# Altium footprint library Apalis Evaluation Board.PcbLib: 166 footprints (part 8 of 11)
Each footprint in its own frame and in the unit in brackets; x right, y up, seen from the top. Pads: shape width x height; smd on the part's side, far side on the other; paste and mask are expansions set on the pad; w line width, h text height; cw(c..) or ccw(c..) is an arc to the next point about the centre after c.
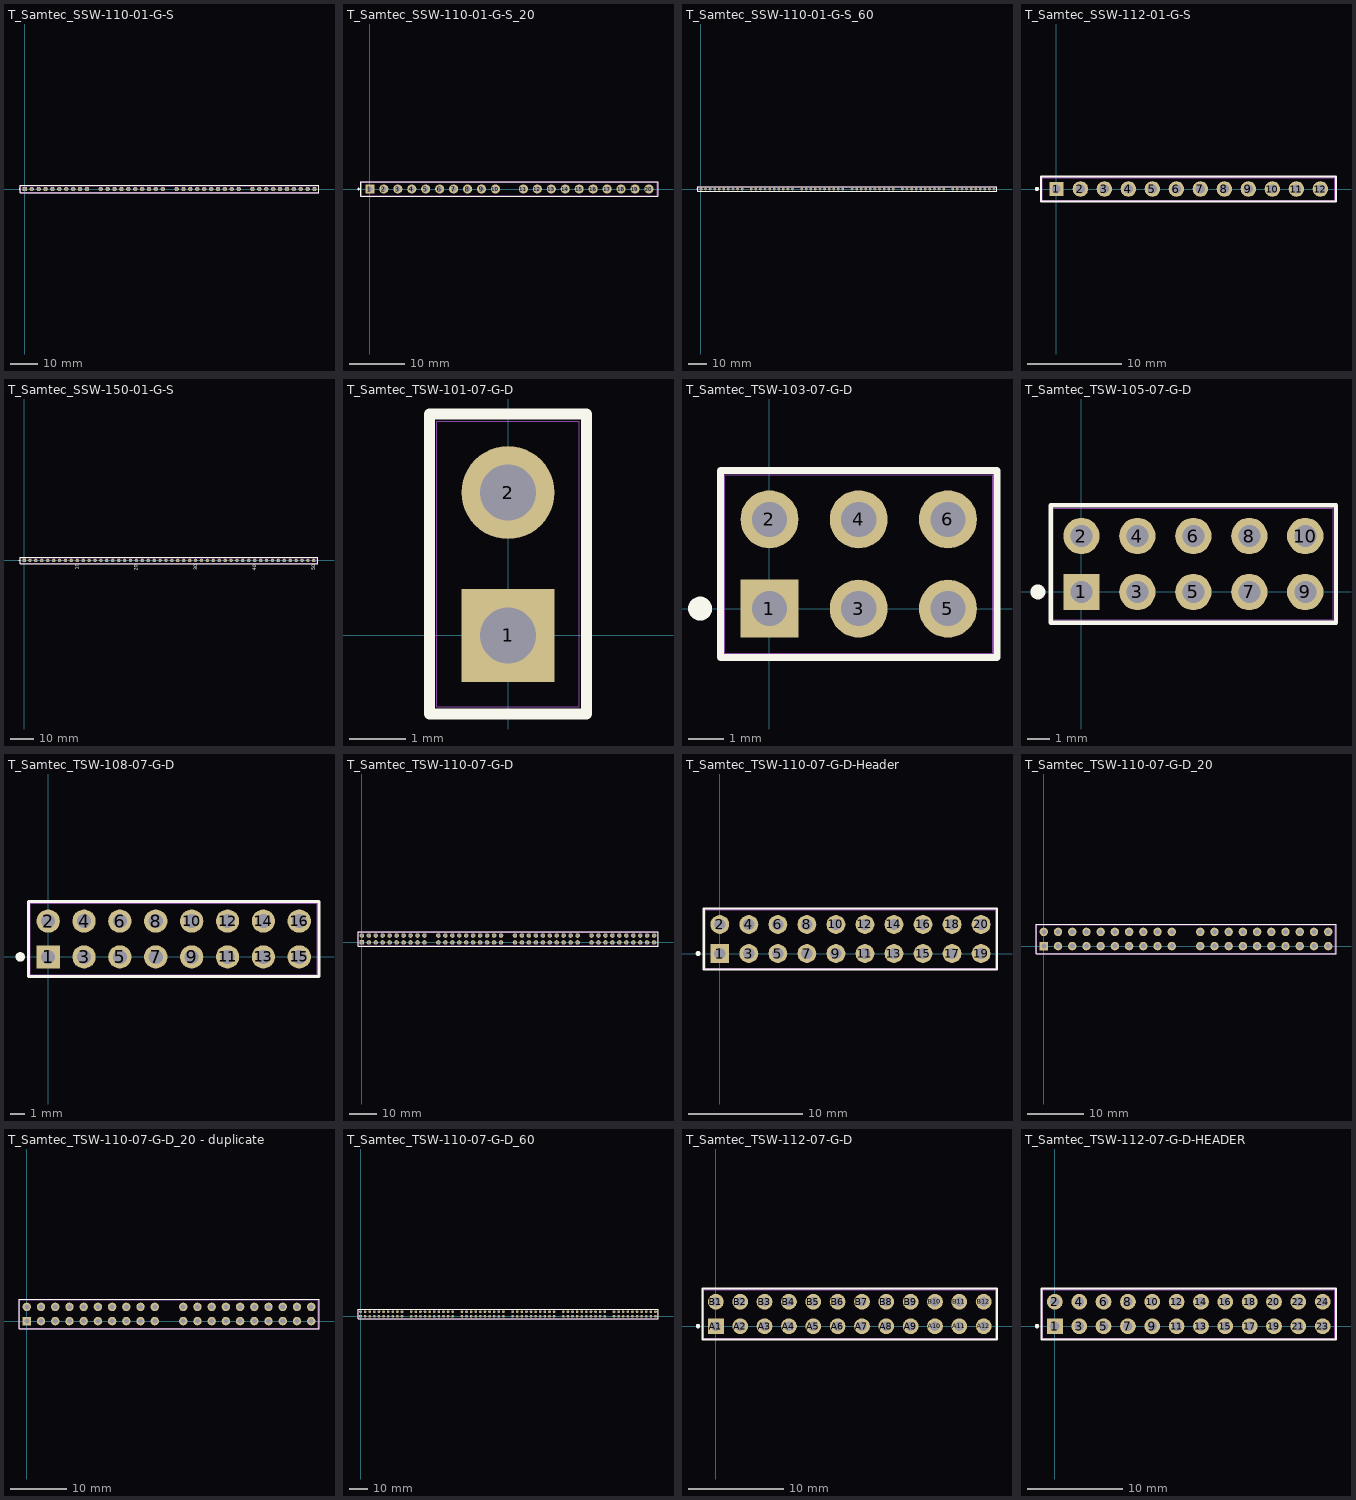
[diagram p7: the footprints below, top view; thin cyan lines are the x and y axes]

## T_Samtec_SSW-110-01-G-S [mm] "Receptacle Female Socket,  1x40 Pins, 2.54 mm pitch"
height 8.51
pads (40):
  rect 1.65x1.65 hole 1: 1(0,0)
  round 1.65 hole 1: 2(2.54,0) 3(5.08,0) 4(7.62,0) 5(10.16,0) 6(12.7,0) 7(15.24,0) 8(17.78,0) 9(20.32,0) 10(22.86,0) 11(27.94,0) 12(30.48,0) 13(33.02,0) 14(35.56,0) 15(38.1,0) 16(40.64,0) 17(43.18,0) 18(45.72,0) 19(48.26,0) 20(50.8,0) 21(55.88,0) 22(58.42,0) 23(60.96,0) 24(63.5,0) 25(66.04,0) 26(68.58,0) 27(71.12,0) 28(73.66,0) 29(76.2,0) 30(78.74,0) 31(83.82,0) 32(86.36,0) 33(88.9,0) 34(91.44,0) 35(93.98,0) 36(96.52,0) 37(99.06,0) 38(101.6,0) 39(104.14,0) 40(106.68,0)
Top Overlay:
  circle w0.25: c-2.067,0.006 r0.1
  lines w0.2: -1.65,-1.33 -1.65,1.33 108.33,1.33 108.33,-1.33 -1.65,-1.33
Mechanical 1:
  lines w0.05: -1.625,-1.305 108.305,-1.305 108.305,1.305 -1.625,1.305 -1.625,-1.305
Mechanical 2:
  lines w0.001: -1.525,-1.205 108.205,-1.205 108.205,1.205 -1.525,1.205 -1.525,-1.205
Mechanical 3:
  lines w0.1: -1.625,-1.305 -1.625,1.305 108.305,1.305 108.305,-1.305 -1.625,-1.305
3D body: height 8.52, standoff -2.63, extent 82.296,-1.206 108.204,1.207
3D body: height 8.52, standoff -2.63, extent 54.356,-1.206 80.264,1.207
3D body: height 8.52, standoff -2.63, extent 26.416,-1.206 52.324,1.207
3D body: height 8.52, standoff -2.63, extent -1.524,-1.206 24.384,1.207

## T_Samtec_SSW-110-01-G-S_20 [mm] "Receptacle Female Socket 1x20 Pins, 2.54 mm pitch"
height 8.51
pads (20):
  rect 1.65x1.65 hole 1: 1(0,0)
  round 1.65 hole 1: 2(2.54,0) 3(5.08,0) 4(7.62,0) 5(10.16,0) 6(12.7,0) 7(15.24,0) 8(17.78,0) 9(20.32,0) 10(22.86,0) 11(27.94,0) 12(30.48,0) 13(33.02,0) 14(35.56,0) 15(38.1,0) 16(40.64,0) 17(43.18,0) 18(45.72,0) 19(48.26,0) 20(50.8,0)
Top Overlay:
  circle w0.25: c-2.067,0.006 r0.1
  lines w0.2: -1.65,-1.33 -1.65,1.33 52.45,1.33 52.45,-1.33 -1.65,-1.33
Mechanical 1:
  lines w0.05: -1.625,-1.305 52.425,-1.305 52.425,1.305 -1.625,1.305 -1.625,-1.305
Mechanical 2:
  lines w0.001: -1.525,-1.205 52.325,-1.205 52.325,1.205 -1.525,1.205 -1.525,-1.205
Mechanical 3:
  lines w0.1: -1.625,-1.305 -1.625,1.305 52.425,1.305 52.425,-1.305 -1.625,-1.305
3D body: height 8.52, standoff -2.63, extent 26.416,-1.206 52.324,1.207
3D body: height 8.52, standoff -2.63, extent -1.524,-1.206 24.384,1.207

## T_Samtec_SSW-110-01-G-S_60 [mm] "Receptacle Female Socket , 1x60 Pins, 2.54 mm pitch"
height 8.51
pads (60):
  rect 1.5x1.5 hole 0.9: 1(0,0)
  round 1.5 hole 0.9: 2(2.54,0) 3(5.08,0) 4(7.62,0) 5(10.16,0) 6(12.7,0) 7(15.24,0) 8(17.78,0) 9(20.32,0) 10(22.86,0) 11(27.94,0) 12(30.48,0) 13(33.02,0) 14(35.56,0) 15(38.1,0) 16(40.64,0) 17(43.18,0) 18(45.72,0) 19(48.26,0) 20(50.8,0) 21(55.88,0) 22(58.42,0) 23(60.96,0) 24(63.5,0) 25(66.04,0) 26(68.58,0) 27(71.12,0) 28(73.66,0) 29(76.2,0) 30(78.74,0) 31(83.82,0) 32(86.36,0) 33(88.9,0) 34(91.44,0) 35(93.98,0) 36(96.52,0) 37(99.06,0) 38(101.6,0) 39(104.14,0) 40(106.68,0) 41(111.76,0) 42(114.3,0) 43(116.84,0) 44(119.38,0) 45(121.92,0) 46(124.46,0) 47(127,0) 48(129.54,0) 49(132.08,0) 50(134.62,0) 51(139.7,0) 52(142.24,0) 53(144.78,0) 54(147.32,0) 55(149.86,0) 56(152.4,0) 57(154.94,0) 58(157.48,0) 59(160.02,0) 60(162.56,0)
Top Overlay:
  circle w0.25: c-2.067,0.006 r0.1
  lines w0.2: -1.65,-1.33 164.21,-1.33 164.21,1.33 -1.65,1.33 -1.65,-1.33
Mechanical 1:
  lines w0.05: -1.625,-1.305 -1.625,1.305 164.185,1.305 164.185,-1.305 -1.625,-1.305
Mechanical 2:
  lines w0.001: -1.525,-1.205 -1.525,1.205 164.085,1.205 164.085,-1.205 -1.525,-1.205
Mechanical 3:
  lines w0.1: -1.625,-1.305 164.185,-1.305 164.185,1.305 -1.625,1.305 -1.625,-1.305
3D body: height 8.52, standoff -2.63, extent 138.176,-1.206 164.084,1.207
3D body: height 8.52, standoff -2.63, extent -1.524,-1.206 24.384,1.207
3D body: height 8.52, standoff -2.63, extent 26.416,-1.206 52.324,1.207
3D body: height 8.52, standoff -2.63, extent 54.356,-1.206 80.264,1.207
3D body: height 8.52, standoff -2.63, extent 82.296,-1.206 108.204,1.207
3D body: height 8.52, standoff -2.63, extent 110.236,-1.206 136.144,1.207

## T_Samtec_SSW-112-01-G-S [mm] "Receptacle Female Socket 1x12 Pins, 2.54 mm pitch"
height 8.51
pads (12):
  rect 1.5x1.5 hole 0.9: 1(0,0)
  round 1.65 hole 1: 2(2.54,0) 3(5.08,0) 4(7.62,0) 5(10.16,0) 6(12.7,0) 7(15.24,0) 8(17.78,0) 9(20.32,0) 10(22.86,0) 11(25.4,0) 12(27.94,0)
Top Overlay:
  circle w0.25: c-2.067,0.006 r0.1
  lines w0.2: -1.65,-1.33 -1.65,1.33 29.59,1.33 29.59,-1.33 -1.65,-1.33
Mechanical 1:
  lines w0.05: -1.625,-1.305 29.565,-1.305 29.565,1.305 -1.625,1.305 -1.625,-1.305
Mechanical 2:
  lines w0.01: -1.525,-1.205 29.465,-1.205 29.465,1.205 -1.525,1.205 -1.525,-1.205
Mechanical 3:
  lines w0.1: -1.625,-1.305 -1.625,1.305 29.565,1.305 29.565,-1.305 -1.625,-1.305
3D body: height 8.52, standoff -2.63, extent -1.524,-1.206 29.464,1.207

## T_Samtec_SSW-150-01-G-S [mm] "Receptacle Female Socket , 1x50 Pins, 2.54 mm pitch"
height 8.51
pads (50):
  rect 1.5x1.5 hole 0.9: 1(0,0)
  round 1.5 hole 0.9: 2(2.54,0) 3(5.08,0) 4(7.62,0) 5(10.16,0) 6(12.7,0) 7(15.24,0) 8(17.78,0) 9(20.32,0) 10(22.86,0) 11(25.4,0) 12(27.94,0) 13(30.48,0) 14(33.02,0) 15(35.56,0) 16(38.1,0) 17(40.64,0) 18(43.18,0) 19(45.72,0) 20(48.26,0) 21(50.8,0) 22(53.34,0) 23(55.88,0) 24(58.42,0) 25(60.96,0) 26(63.5,0) 27(66.04,0) 28(68.58,0) 29(71.12,0) 30(73.66,0) 31(76.2,0) 32(78.74,0) 33(81.28,0) 34(83.82,0) 35(86.36,0) 36(88.9,0) 37(91.44,0) 38(93.98,0) 39(96.52,0) 40(99.06,0) 41(101.6,0) 42(104.14,0) 43(106.68,0) 44(109.22,0) 45(111.76,0) 46(114.3,0) 47(116.84,0) 48(119.38,0) 49(121.92,0) 50(124.46,0)
Top Overlay:
  circle w0.25: c-2.067,0.006 r0.1
  lines w0.2: -1.65,-1.33 126.11,-1.33 126.11,1.33 -1.65,1.33 -1.65,-1.33
  text "50" at 125.146,-4.216 h1.52
  text "40" at 99.771,-4.394 h1.52
  text "30" at 74.333,-4.242 h1.52
  text "20" at 48.933,-4.369 h1.52
  text "10" at 23.495,-4.051 h1.52
Mechanical 1:
  lines w0.05: -1.625,-1.305 -1.625,1.305 126.085,1.305 126.085,-1.305 -1.625,-1.305
Mechanical 2:
  lines w0.001: -1.525,-1.205 -1.525,1.205 125.985,1.205 125.985,-1.205 -1.525,-1.205
Mechanical 3:
  lines w0.1: -1.625,-1.305 126.085,-1.305 126.085,1.305 -1.625,1.305 -1.625,-1.305
3D body: height 8.52, standoff -2.63, extent -1.524,-1.206 125.984,1.207

## T_Samtec_TSW-101-07-G-D [mm] "Header, 1x2 Pins, 2.54 mm pitch, male"
height 8.51
pads (2):
  rect 1.65x1.65 hole 1: 1(0,0)
  round 1.65 hole 1: 2(0,2.54)
Top Overlay:
  lines w0.2: -1.395,-1.395 -1.395,3.935 1.395,3.935 1.395,-1.395 -1.395,-1.395
Mechanical 1:
  lines w0.05: -1.37,-1.37 1.37,-1.37 1.37,3.91 -1.37,3.91 -1.37,-1.37
Mechanical 2:
  lines w0.001: -1.27,-1.27 -1.27,3.81 1.27,3.81 1.27,-1.27 -1.27,-1.27
Mechanical 3:
  lines w0.1: -1.37,-1.37 1.37,-1.37 1.37,3.91 -1.37,3.91 -1.37,-1.37
3D body: height 8.4, standoff -2.52, extent -1.27,-1.27 1.27,3.81

## T_Samtec_TSW-103-07-G-D [mm] "Header, 2x3 Pins, 2.54 mm pitch, male"
height 8.51
pads (6):
  rect 1.65x1.65 hole 1: 1(0,0)
  round 1.65 hole 1: 2(0,2.54) 3(2.54,0) 4(2.54,2.54) 5(5.08,0) 6(5.08,2.54)
Top Overlay:
  circle w0.5: c-1.975,0 r0.088
  lines w0.2: -1.395,-1.395 6.475,-1.395 6.475,3.935 -1.395,3.935 -1.395,-1.395
Mechanical 1:
  lines w0.05: -1.37,-1.37 -1.37,3.91 6.45,3.91 6.45,-1.37 -1.37,-1.37
Mechanical 2:
  lines w0.001: -1.27,-1.27 -1.27,3.81 6.35,3.81 6.35,-1.27 -1.27,-1.27
Mechanical 3:
  lines w0.1: -1.37,-1.37 6.45,-1.37 6.45,3.91 -1.37,3.91 -1.37,-1.37
3D body: height 8.4, standoff -2.52, extent -1.27,-1.27 6.35,3.81

## T_Samtec_TSW-105-07-G-D [mm] "Header, 2x5 Pins, 2.54 mm pitch, male"
height 8.51
pads (10):
  rect 1.65x1.65 hole 1: 1(0,0)
  round 1.65 hole 1: 2(0,2.54) 3(2.54,0) 4(2.54,2.54) 5(5.08,0) 6(5.08,2.54) 7(7.62,0) 8(7.62,2.54) 9(10.16,0) 10(10.16,2.54)
Top Overlay:
  circle w0.5: c-1.975,0 r0.088
  lines w0.2: 11.55,-1.395 -1.395,-1.395 -1.395,3.935 11.55,3.935 ; 11.555,-1.395 11.555,3.935
Mechanical 1:
  lines w0.05: -1.37,-1.37 -1.37,3.91 11.53,3.91 11.53,-1.37 -1.37,-1.37
Mechanical 2:
  lines w0.001: -1.27,-1.27 11.43,-1.27 11.43,3.81 -1.27,3.81 -1.27,-1.27
Mechanical 3:
  lines w0.1: -1.37,-1.37 11.53,-1.37 11.53,3.91 -1.37,3.91 -1.37,-1.37
3D body: height 8.4, standoff -2.52, extent -1.27,-1.27 11.43,3.81

## T_Samtec_TSW-108-07-G-D [mm] "Header, 2x8 Pins, 2.54 mm pitch, male"
height 8.51
pads (16):
  rect 1.65x1.65 hole 1: 1(0,0)
  round 1.65 hole 1: 2(0,2.54) 3(2.54,0) 4(2.54,2.54) 5(5.08,0) 6(5.08,2.54) 7(7.62,0) 8(7.62,2.54) 9(10.16,0) 10(10.16,2.54) 11(12.7,0) 12(12.7,2.54) 13(15.24,0) 14(15.24,2.54) 15(17.78,0) 16(17.78,2.54)
Top Overlay:
  circle w0.5: c-1.975,0 r0.088
  lines w0.2: -1.395,-1.395 -1.395,3.935 19.175,3.935 19.175,-1.395 -1.395,-1.395
Mechanical 1:
  lines w0.05: -1.37,-1.37 19.15,-1.37 19.15,3.91 -1.37,3.91 -1.37,-1.37
Mechanical 2:
  lines w0.001: -1.27,-1.27 -1.27,3.81 19.05,3.81 19.05,-1.27 -1.27,-1.27
Mechanical 3:
  lines w0.1: -1.37,-1.37 -1.37,3.91 19.15,3.91 19.15,-1.37 -1.37,-1.37
3D body: height 8.4, standoff -2.52, extent -1.27,-1.27 19.05,3.81

## T_Samtec_TSW-110-07-G-D [mm] "Header 2x50 pin 2.54mm pitch"
height 10.8
pads (80):
  rect 1.65x1.65 hole 1: A1(0,0)
  round 1.65 hole 1: A2(2.54,0) A3(5.08,0) A4(7.62,0) A5(10.16,0) A6(12.7,0) A7(15.24,0) A8(17.78,0) A9(20.32,0) A10(22.86,0) A11(27.94,0) A12(30.48,0) A13(33.02,0) A14(35.56,0) A15(38.1,0) A16(40.64,0) A17(43.18,0) A18(45.72,0) A19(48.26,0) A20(50.8,0) A21(55.88,0) A22(58.42,0) A23(60.96,0) A24(63.5,0) A25(66.04,0) A26(68.58,0) A27(71.12,0) A28(73.66,0) A29(76.2,0) A30(78.74,0) A31(83.82,0) A32(86.36,0) A33(88.9,0) A34(91.44,0) A35(93.98,0) A36(96.52,0) A37(99.06,0) A38(101.6,0) A39(104.14,0) A40(106.68,0) B1(0,2.54) B2(2.54,2.54) B3(5.08,2.54) B4(7.62,2.54) B5(10.16,2.54) B6(12.7,2.54) B7(15.24,2.54) B8(17.78,2.54) B9(20.32,2.54) B10(22.86,2.54) B11(27.94,2.54) B12(30.48,2.54) B13(33.02,2.54) B14(35.56,2.54) B15(38.1,2.54) B16(40.64,2.54) B17(43.18,2.54) B18(45.72,2.54) B19(48.26,2.54) B20(50.8,2.54) B21(55.88,2.54) B22(58.42,2.54) B23(60.96,2.54) B24(63.5,2.54) B25(66.04,2.54) B26(68.58,2.54) B27(71.12,2.54) B28(73.66,2.54) B29(76.2,2.54) B30(78.74,2.54) B31(83.82,2.54) B32(86.36,2.54) B33(88.9,2.54) B34(91.44,2.54) B35(93.98,2.54) B36(96.52,2.54) B37(99.06,2.54) B38(101.6,2.54) B39(104.14,2.54) B40(106.68,2.54)
Top Overlay:
  lines w0.2: -1.395,-1.395 -1.395,3.935 108.075,3.935 108.075,-1.395 -1.395,-1.395
Mechanical 1:
  lines w0.05: -1.37,-1.37 -1.37,3.91 108.05,3.91 108.05,-1.37 -1.37,-1.37
Mechanical 2:
  lines w0.001: 107.95,-1.27 107.95,3.81 ; 107.95,-1.27 107.95,3.81 ; 107.95,-1.27 -1.27,-1.27 -1.27,3.81 107.95,3.81
Mechanical 3:
  lines w0.1: -1.37,-1.37 108.05,-1.37 108.05,3.91 -1.37,3.91 -1.37,-1.37
3D body: height 8.4, standoff -2.52, extent 82.55,-1.27 107.95,3.81
3D body: height 8.4, standoff -2.52, extent 54.61,-1.27 80.01,3.81
3D body: height 8.4, standoff -2.52, extent 26.67,-1.27 52.07,3.81
3D body: height 8.4, standoff -2.52, extent -1.27,-1.27 24.13,3.81

## T_Samtec_TSW-110-07-G-D-Header [mm] "Header, 2x10 Pins, 2.54 mm pitch"
height 8.51
pads (20):
  rect 1.65x1.65 hole 1: 1(0,0)
  round 1.65 hole 1: 2(0,2.54) 3(2.54,0) 4(2.54,2.54) 5(5.08,0) 6(5.08,2.54) 7(7.62,0) 8(7.62,2.54) 9(10.16,0) 10(10.16,2.54) 11(12.7,0) 12(12.7,2.54) 13(15.24,0) 14(15.24,2.54) 15(17.78,0) 16(17.78,2.54) 17(20.32,0) 18(20.32,2.54) 19(22.86,0) 20(22.86,2.54)
Top Overlay:
  circle w0.25: c-1.896,0 r0.1
  lines w0.2: -1.395,-1.395 -1.395,3.935 24.255,3.935 24.255,-1.349 24.209,-1.395 -1.395,-1.395
Mechanical 1:
  lines w0.05: -1.37,-1.374 24.23,-1.374 24.23,3.916 -1.37,3.916 -1.37,-1.374
Mechanical 2:
  lines w0.001: -1.27,-1.27 24.13,-1.27 24.13,3.81 -1.27,3.81 -1.27,-1.27
Mechanical 3:
  lines w0.1: -1.37,-1.37 24.23,-1.37 24.23,3.91 -1.37,3.91 -1.37,-1.37
3D body: height 8.4, standoff -2.52, extent -1.27,-1.27 24.13,3.81

## T_Samtec_TSW-110-07-G-D_20 [mm] "Header 2x20 pin 2.54mm pitch"
height 10.8
pads (40):
  rect 1.5x1.5 hole 0.9: A1(0,0)
  round 1.5 hole 0.9: A2(2.54,0) A3(5.08,0) A4(7.62,0) A5(10.16,0) A6(12.7,0) A7(15.24,0) A8(17.78,0) A9(20.32,0) A10(22.86,0) A11(27.94,0) A12(30.48,0) A13(33.02,0) A14(35.56,0) A15(38.1,0) A16(40.64,0) A17(43.18,0) A18(45.72,0) A19(48.26,0) A20(50.8,0) B1(0,2.54) B2(2.54,2.54) B3(5.08,2.54) B4(7.62,2.54) B5(10.16,2.54) B6(12.7,2.54) B7(15.24,2.54) B8(17.78,2.54) B9(20.32,2.54) B10(22.86,2.54) B11(27.94,2.54) B12(30.48,2.54) B13(33.02,2.54) B14(35.56,2.54) B15(38.1,2.54) B16(40.64,2.54) B17(43.18,2.54) B18(45.72,2.54) B19(48.26,2.54) B20(50.8,2.54)
Top Overlay:
  lines w0.2: -1.395,-1.395 -1.395,3.935 52.195,3.935 52.195,-1.395 -1.395,-1.395
Mechanical 1:
  lines w0.05: -1.37,-1.37 -1.37,3.91 52.17,3.91 52.17,-1.37 -1.37,-1.37
Mechanical 2:
  lines w0.001: 52.07,-1.27 -1.27,-1.27 -1.27,3.81 52.07,3.81 ; 52.07,-1.27 52.07,3.81 ; 52.07,-1.27 52.07,3.81
Mechanical 3:
  lines w0.1: -1.37,-1.37 52.17,-1.37 52.17,3.91 -1.37,3.91 -1.37,-1.37
3D body: height 8.4, standoff -2.52, extent 26.67,-1.27 52.07,3.81
3D body: height 8.4, standoff -2.52, extent -1.27,-1.27 24.13,3.81

## T_Samtec_TSW-110-07-G-D_20 - duplicate [mm] "Header 2x20 pin 2.54mm pitch"
height 10.8
pads (40):
  rect 1.5x1.5 hole 0.9: A1(0,0)
  round 1.5 hole 0.9: A2(2.54,0) A3(5.08,0) A4(7.62,0) A5(10.16,0) A6(12.7,0) A7(15.24,0) A8(17.78,0) A9(20.32,0) A10(22.86,0) A11(27.94,0) A12(30.48,0) A13(33.02,0) A14(35.56,0) A15(38.1,0) A16(40.64,0) A17(43.18,0) A18(45.72,0) A19(48.26,0) A20(50.8,0) B1(0,2.54) B2(2.54,2.54) B3(5.08,2.54) B4(7.62,2.54) B5(10.16,2.54) B6(12.7,2.54) B7(15.24,2.54) B8(17.78,2.54) B9(20.32,2.54) B10(22.86,2.54) B11(27.94,2.54) B12(30.48,2.54) B13(33.02,2.54) B14(35.56,2.54) B15(38.1,2.54) B16(40.64,2.54) B17(43.18,2.54) B18(45.72,2.54) B19(48.26,2.54) B20(50.8,2.54)
Top Overlay:
  lines w0.2: -1.395,-1.395 52.195,-1.395 52.195,3.935 -1.395,3.935 -1.395,-1.395
Mechanical 1:
  lines w0.05: -1.37,-1.37 52.17,-1.37 52.17,3.91 -1.37,3.91 -1.37,-1.37
Mechanical 2:
  lines w0.001: 52.07,-1.27 52.07,3.81 ; 52.07,-1.27 52.07,3.81 ; 52.07,-1.27 -1.27,-1.27 -1.27,3.81 52.07,3.81
Mechanical 3:
  lines w0.1: -1.37,-1.37 -1.37,3.91 52.17,3.91 52.17,-1.37 -1.37,-1.37
3D body: height 8.4, standoff -2.52, extent -1.27,-1.27 24.13,3.81
3D body: height 8.4, standoff -2.52, extent 26.67,-1.27 52.07,3.81

## T_Samtec_TSW-110-07-G-D_60 [mm] "Header 2x60 pin 2.54mm pitch"
height 10.8
pads (120):
  rect 1.5x1.5 hole 0.9: A1(0,0)
  round 1.5 hole 0.9: A2(2.54,0) A3(5.08,0) A4(7.62,0) A5(10.16,0) A6(12.7,0) A7(15.24,0) A8(17.78,0) A9(20.32,0) A10(22.86,0) A11(27.94,0) A12(30.48,0) A13(33.02,0) A14(35.56,0) A15(38.1,0) A16(40.64,0) A17(43.18,0) A18(45.72,0) A19(48.26,0) A20(50.8,0) A21(55.88,0) A22(58.42,0) A23(60.96,0) A24(63.5,0) A25(66.04,0) A26(68.58,0) A27(71.12,0) A28(73.66,0) A29(76.2,0) A30(78.74,0) A31(83.82,0) A32(86.36,0) A33(88.9,0) A34(91.44,0) A35(93.98,0) A36(96.52,0) A37(99.06,0) A38(101.6,0) A39(104.14,0) A40(106.68,0) A41(111.76,0) A42(114.3,0) A43(116.84,0) A44(119.38,0) A45(121.92,0) A46(124.46,0) A47(127,0) A48(129.54,0) A49(132.08,0) A50(134.62,0) A51(139.7,0) A52(142.24,0) A53(144.78,0) A54(147.32,0) A55(149.86,0) A56(152.4,0) A57(154.94,0) A58(157.48,0) A59(160.02,0) A60(162.56,0) B1(0,2.54) B2(2.54,2.54) B3(5.08,2.54) B4(7.62,2.54) B5(10.16,2.54) B6(12.7,2.54) B7(15.24,2.54) B8(17.78,2.54) B9(20.32,2.54) B10(22.86,2.54) B11(27.94,2.54) B12(30.48,2.54) B13(33.02,2.54) B14(35.56,2.54) B15(38.1,2.54) B16(40.64,2.54) B17(43.18,2.54) B18(45.72,2.54) B19(48.26,2.54) B20(50.8,2.54) B21(55.88,2.54) B22(58.42,2.54) B23(60.96,2.54) B24(63.5,2.54) B25(66.04,2.54) B26(68.58,2.54) B27(71.12,2.54) B28(73.66,2.54) B29(76.2,2.54) B30(78.74,2.54) B31(83.82,2.54) B32(86.36,2.54) B33(88.9,2.54) B34(91.44,2.54) B35(93.98,2.54) B36(96.52,2.54) B37(99.06,2.54) B38(101.6,2.54) B39(104.14,2.54) B40(106.68,2.54) B41(111.76,2.54) B42(114.3,2.54) B43(116.84,2.54) B44(119.38,2.54) B45(121.92,2.54) B46(124.46,2.54) B47(127,2.54) B48(129.54,2.54) B49(132.08,2.54) B50(134.62,2.54) B51(139.7,2.54) B52(142.24,2.54) B53(144.78,2.54) B54(147.32,2.54) B55(149.86,2.54) B56(152.4,2.54) B57(154.94,2.54) B58(157.48,2.54) B59(160.02,2.54) B60(162.56,2.54)
Top Overlay:
  lines w0.2: -1.395,-1.395 163.955,-1.395 163.955,3.935 -1.395,3.935 -1.395,-1.395
Mechanical 1:
  lines w0.05: -1.37,-1.37 163.93,-1.37 163.93,3.91 -1.37,3.91 -1.37,-1.37
Mechanical 2:
  lines w0.001: 163.83,-1.27 -1.27,-1.27 -1.27,3.81 163.83,3.81 ; 163.83,-1.27 163.83,3.81 ; 163.83,-1.27 163.83,3.81
Mechanical 3:
  lines w0.1: -1.37,-1.37 163.93,-1.37 163.93,3.91 -1.37,3.91 -1.37,-1.37
3D body: height 8.4, standoff -2.52, extent -1.27,-1.27 24.13,3.81
3D body: height 8.4, standoff -2.52, extent 26.67,-1.27 52.07,3.81
3D body: height 8.4, standoff -2.52, extent 54.61,-1.27 80.01,3.81
3D body: height 8.4, standoff -2.52, extent 82.55,-1.27 107.95,3.81
3D body: height 8.4, standoff -2.52, extent 110.49,-1.27 135.89,3.81
3D body: height 8.4, standoff -2.52, extent 138.43,-1.27 163.83,3.81

## T_Samtec_TSW-112-07-G-D [mm] "Header, 2x12 Pins, 2.54 mm pitch, male"
height 8.51
pads (24):
  rect 1.65x1.65 hole 1: A1(0,0)
  round 1.65 hole 1: A2(2.54,0) A3(5.08,0) A4(7.62,0) A5(10.16,0) A6(12.7,0) A7(15.24,0) A8(17.78,0) A9(20.32,0) A10(22.86,0) A11(25.4,0) A12(27.94,0) B1(0,2.54) B2(2.54,2.54) B3(5.08,2.54) B4(7.62,2.54) B5(10.16,2.54) B6(12.7,2.54) B7(15.24,2.54) B8(17.78,2.54) B9(20.32,2.54) B10(22.86,2.54) B11(25.4,2.54) B12(27.94,2.54)
Top Overlay:
  circle w0.25: c-1.871,0 r0.1
  lines w0.2: -1.395,-1.395 -1.395,3.935 29.335,3.935 29.335,-1.395 -1.395,-1.395
Mechanical 1:
  lines w0.05: -1.37,-1.373 -1.37,3.91 29.31,3.91 29.31,-1.373 -1.37,-1.373
Mechanical 2:
  lines w0.001: -1.27,-1.27 -1.27,3.81 29.21,3.81 29.21,-1.27 -1.27,-1.27
Mechanical 3:
  lines w0.1: -1.37,-1.37 -1.37,3.91 29.31,3.91 29.31,-1.37 -1.37,-1.37
3D body: height 8.4, standoff -2.52, extent -1.27,-1.27 29.21,3.81

## T_Samtec_TSW-112-07-G-D-HEADER [mm] "Header, 2x12 Pins, 2.54 mm pitch, male"
height 8.51
pads (24):
  rect 1.65x1.65 hole 1: 1(0,0)
  round 1.65 hole 1: 2(0,2.54) 3(2.54,0) 4(2.54,2.54) 5(5.08,0) 6(5.08,2.54) 7(7.62,0) 8(7.62,2.54) 9(10.16,0) 10(10.16,2.54) 11(12.7,0) 12(12.7,2.54) 13(15.24,0) 14(15.24,2.54) 15(17.78,0) 16(17.78,2.54) 17(20.32,0) 18(20.32,2.54) 19(22.86,0) 20(22.86,2.54) 21(25.4,0) 22(25.4,2.54) 23(27.94,0) 24(27.94,2.54)
Top Overlay:
  circle w0.25: c-1.871,0 r0.1
  lines w0.2: -1.395,-1.395 -1.395,3.935 29.335,3.935 29.335,-1.395 -1.395,-1.395
Mechanical 1:
  lines w0.05: -1.37,-1.373 -1.37,3.91 29.31,3.91 29.31,-1.373 -1.37,-1.373
Mechanical 2:
  lines w0.001: -1.27,-1.27 -1.27,3.81 29.21,3.81 29.21,-1.27 -1.27,-1.27
Mechanical 3:
  lines w0.1: -1.37,-1.37 -1.37,3.91 29.31,3.91 29.31,-1.37 -1.37,-1.37
3D body: height 8.4, standoff -2.52, extent -1.27,-1.27 29.21,3.81